# Altium footprint library Connectors THD.PcbLib: 631 footprints (part 22 of 46)
Each footprint in its own frame and in the unit in brackets; x right, y up, seen from the top. Pads: shape width x height; smd on the part's side, far side on the other; paste and mask are expansions set on the pad; w line width, h text height; cw(c..) or ccw(c..) is an arc to the next point about the centre after c.
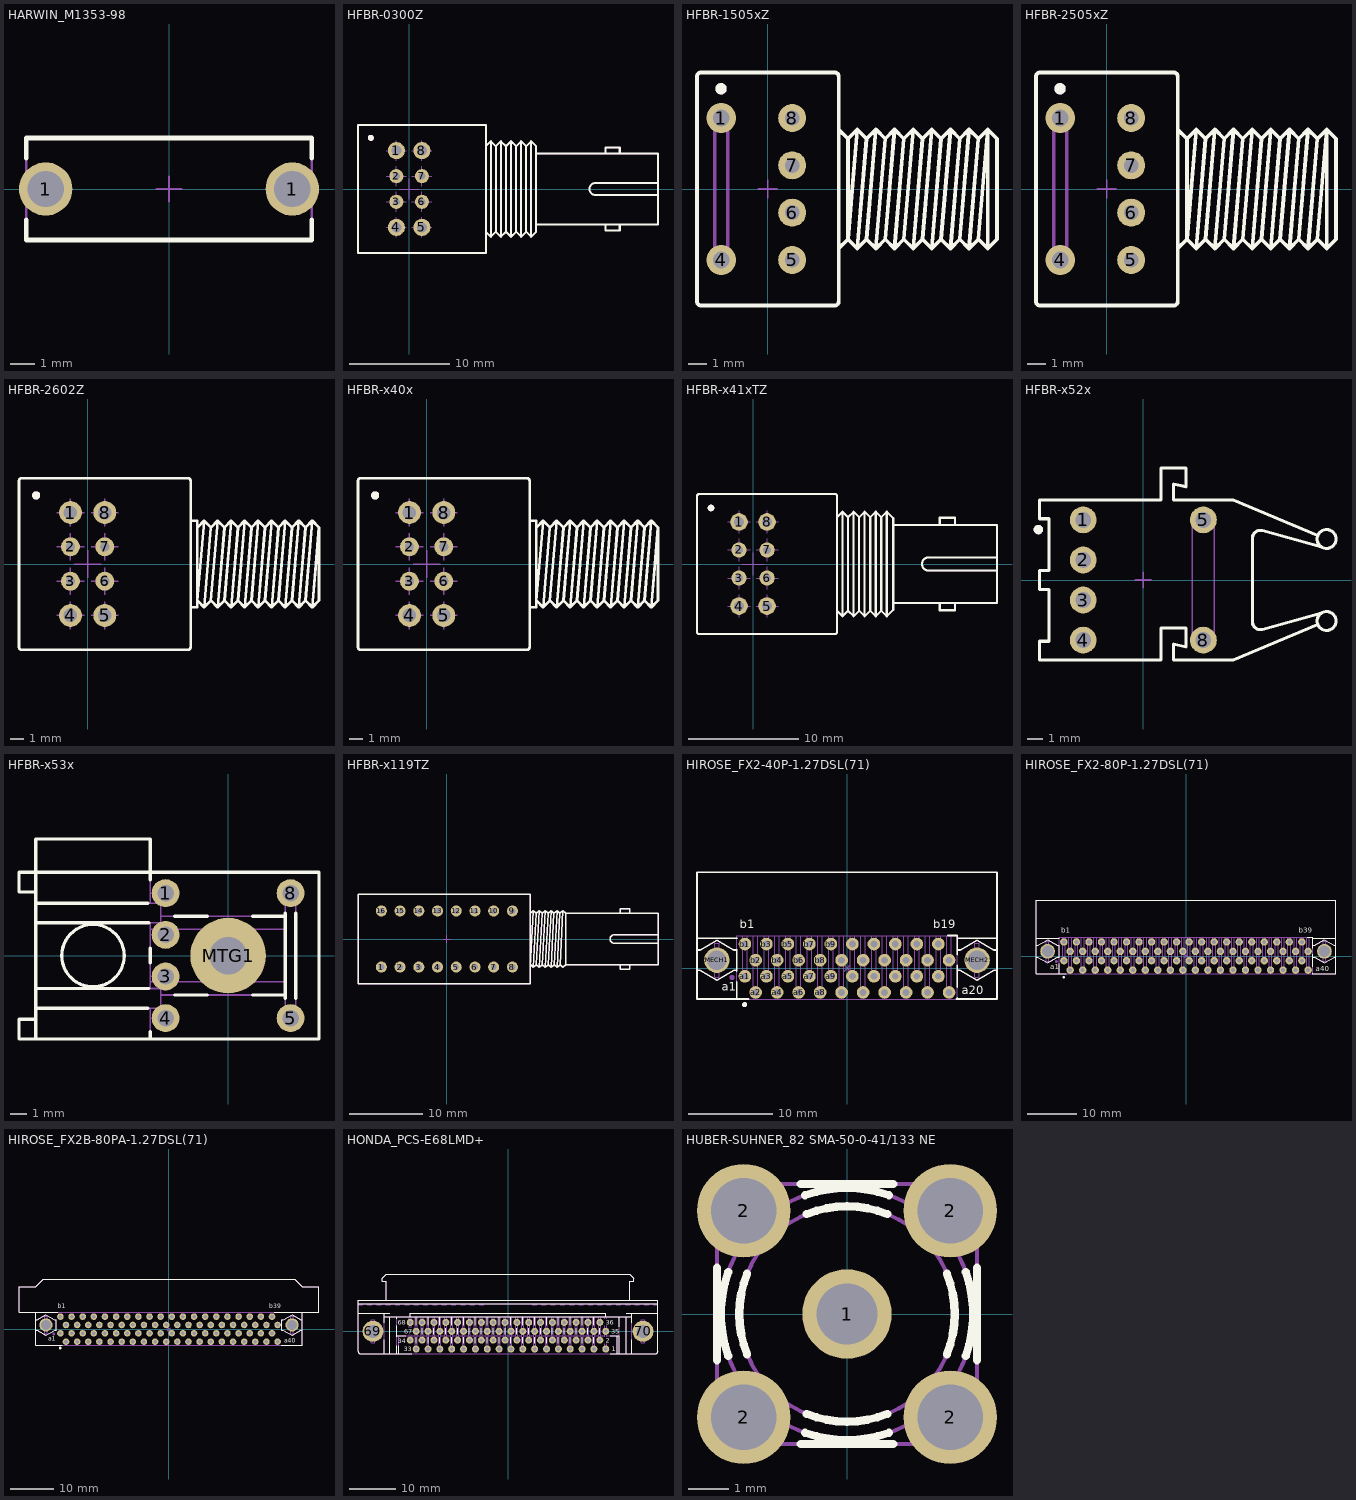
[diagram p21: the footprints below, top view; thin cyan lines are the x and y axes]

## HARWIN_M1353-98 [mm] "PC Board Test Jack for Ø2.03mm Probe"
height 5.16
pads (2):
  round 2.2 hole 1.5: 1(-5.08,0) 1(5.08,0)
Top Overlay:
  lines w0.2: -5.88,-1.269 -5.88,-2.105 5.88,-2.105 5.88,-1.269 ; -5.88,1.269 -5.88,2.105 5.88,2.105 5.88,1.269
Mechanical 8:
  lines w0.1: -5.58,0 -5.08,0 ; -5.08,-0.5 -5.08,0 ; -5.08,0.5 -5.08,0 ; -4.58,0 -5.08,0 ; -0.5,0 0,0 ; 0,-0.5 0,0 ; 0,0.5 0,0 ; 0.5,0 0,0 ; 4.58,0 5.08,0 ; 5.08,-0.5 5.08,0 ; 5.08,0.5 5.08,0 ; 5.58,0 5.08,0
Mechanical 14:
  lines w0.1: -5.88,-2.105 -5.88,2.105 5.88,2.105 5.88,-2.105 -5.88,-2.105
3D body: height 5.16, standoff -2.79, extent -5.88,-2.105 5.88,2.105

## HFBR-0300Z [mm] "HFBR-0300Z Series, Fiber Optic Transmitter or Receiver, Through Hole Mount"
height 10.2
pads (8):
  round 1.7 hole 1: 1(-1.27,3.81) 4(-1.27,-3.81) 5(1.27,-3.81) 8(1.27,3.81)
  round 1.4 hole 0.7: 2(-1.27,1.27) 3(-1.27,-1.27) 6(1.27,-1.27) 7(1.27,1.27)
Top Overlay:
  circle w0.3: c-3.81,5.08 r0.15
  lines w0.2: 7.62,-4.25 8.12,-4.75 ; 7.62,4.25 8.12,4.75 ; 12.62,-3.525 24.72,-3.525 ; 12.62,3.525 24.72,3.525 ; 19.52,-3.525 19.52,-4.1 20.92,-4.1 20.92,-3.525 ; 19.52,3.525 19.52,4.1 20.92,4.1 20.92,3.525 ; 24.72,-0.6 18.52,-0.6 cw(c18.52,0) 18.52,0.6 24.72,0.6 ; 8.12,-4.75 8.62,-4.25 ; 8.12,-4.75 8.12,4.75 ; 8.12,4.75 8.62,4.25 ; 8.62,-4.25 9.12,-4.75 ; 8.62,-4.25 8.62,4.25 ; 8.62,4.25 9.12,4.75 ; 9.12,-4.75 9.62,-4.25 ; 9.12,-4.75 9.12,4.75 ; 9.12,4.75 9.62,4.25 ; 9.62,-4.25 10.12,-4.75 ; 9.62,-4.25 9.62,4.25 ; 9.62,4.25 10.12,4.75 ; 10.12,-4.75 10.62,-4.25 ; 10.12,-4.75 10.12,4.75 ; 10.12,4.75 10.62,4.25 ; 10.62,-4.25 11.12,-4.75 ; 10.62,-4.25 10.62,4.25 ; 10.62,4.25 11.12,4.75 ; 11.12,-4.75 11.62,-4.25 ; 11.12,-4.75 11.12,4.75 ; 11.12,4.75 11.62,4.25 ; 11.62,-4.25 12.12,-4.75 ; 11.62,-4.25 11.62,4.25 ; 11.62,4.25 12.12,4.75 ; 12.12,-4.75 12.62,-4.25 12.62,4.25 12.12,4.75 ; 12.12,-4.75 12.12,4.75 ; 24.72,-3.525 24.72,3.525 ; 24.72,-3.525 24.72,3.525 ; -5.08,-6.35 -5.08,6.35 7.62,6.35 7.62,-6.35 -5.08,-6.35
Mechanical 8:
  lines w0.1: -2.27,-3.81 -1.27,-3.81 ; -2.27,-1.27 -1.27,-1.27 ; -2.27,1.27 -1.27,1.27 ; -2.27,3.81 -1.27,3.81 ; -1.27,-4.81 -1.27,-3.81 ; -1.27,-2.81 -1.27,-3.81 ; -1.27,-2.27 -1.27,-1.27 ; -1.27,-0.27 -1.27,-1.27 ; -1.27,0.27 -1.27,1.27 ; -1.27,2.27 -1.27,1.27 ; -1.27,2.81 -1.27,3.81 ; -1.27,4.81 -1.27,3.81 ; -1,0 0,0 ; -0.27,-3.81 -1.27,-3.81 ; -0.27,-1.27 -1.27,-1.27 ; -0.27,1.27 -1.27,1.27 ; -0.27,3.81 -1.27,3.81 ; 0,-1 0,0 ; 0,1 0,0 ; 0.27,-3.81 1.27,-3.81 ; 0.27,-1.27 1.27,-1.27 ; 0.27,1.27 1.27,1.27 ; 0.27,3.81 1.27,3.81 ; 1,0 0,0 ; 1.27,-4.81 1.27,-3.81 ; 1.27,-2.81 1.27,-3.81 ; 1.27,-2.27 1.27,-1.27 ; 1.27,-0.27 1.27,-1.27 ; 1.27,0.27 1.27,1.27 ; 1.27,2.27 1.27,1.27 ; 1.27,2.81 1.27,3.81 ; 1.27,4.81 1.27,3.81 ; 2.27,-3.81 1.27,-3.81 ; 2.27,-1.27 1.27,-1.27 ; 2.27,1.27 1.27,1.27 ; 2.27,3.81 1.27,3.81
Mechanical 14:
  circle w0.3: c-3.81,5.08 r0.15
  lines w0.1: 7.62,-4.25 8.12,-4.75 ; 7.62,4.25 8.12,4.75 ; 12.62,-3.525 24.72,-3.525 24.72,3.525 12.62,3.525 ; 19.52,-3.525 19.52,-4.1 20.92,-4.1 20.92,-3.525 ; 19.52,3.525 19.52,4.1 20.92,4.1 20.92,3.525 ; 24.72,-0.6 18.52,-0.6 cw(c18.52,0) 18.52,0.6 24.72,0.6 ; 8.12,-4.75 8.62,-4.25 ; 8.12,-4.75 8.12,4.75 ; 8.12,4.75 8.62,4.25 ; 8.62,-4.25 9.12,-4.75 ; 8.62,-4.25 8.62,4.25 ; 8.62,4.25 9.12,4.75 ; 9.12,-4.75 9.62,-4.25 ; 9.12,-4.75 9.12,4.75 ; 9.12,4.75 9.62,4.25 ; 9.62,-4.25 10.12,-4.75 ; 9.62,-4.25 9.62,4.25 ; 9.62,4.25 10.12,4.75 ; 10.12,-4.75 10.62,-4.25 ; 10.12,-4.75 10.12,4.75 ; 10.12,4.75 10.62,4.25 ; 10.62,-4.25 11.12,-4.75 ; 10.62,-4.25 10.62,4.25 ; 10.62,4.25 11.12,4.75 ; 11.12,-4.75 11.62,-4.25 ; 11.12,-4.75 11.12,4.75 ; 11.12,4.75 11.62,4.25 ; 11.62,-4.25 12.12,-4.75 ; 11.62,-4.25 11.62,4.25 ; 11.62,4.25 12.12,4.75 ; 12.12,-4.75 12.62,-4.25 12.62,4.25 12.12,4.75 ; 12.12,-4.75 12.12,4.75 ; -5.08,-6.15 ccw(c-4.88,-6.15) -4.88,-6.35 7.42,-6.35 ccw(c7.42,-6.15) 7.62,-6.15 7.62,6.15 ccw(c7.42,6.15) 7.42,6.35 -4.88,6.35 ccw(c-4.88,6.15) -5.08,6.15 -5.08,-6.15
3D body: height 10.2, standoff -3.6, extent -5.08,-6.35 24.72,6.35

## HFBR-1505xZ [mm] "HFBR-1505xZ Series, SMA Plastic Housed, Fiber Optic Transmitter"
height 10.2
pads (6):
  round 1.6 hole 0.9: 1(-2.5,3.81) 4(-2.5,-3.81)
  round 1.5 hole 0.8: 5(1.31,-3.81) 6(1.31,-1.27) 7(1.31,1.27) 8(1.31,3.81)
Top Overlay:
  circle w0.3: c-2.51,5.38 r0.15
  lines w0.2: 3.8,-3.2 4.3,-2.7 ; 3.8,3.2 4.3,2.7 ; 4.3,-2.7 4.3,2.7 ; 4.3,-2.7 4.8,-3.2 ; 4.3,-2.7 4.8,3.2 ; 4.3,2.7 4.8,3.2 ; 4.8,-3.2 5.3,-2.7 ; 4.8,-3.2 5.3,2.7 ; 4.8,3.2 5.3,2.7 ; 5.3,-2.7 5.8,-3.2 ; 5.3,-2.7 5.8,3.2 ; 5.3,2.7 5.8,3.2 ; 5.8,-3.2 6.3,-2.7 ; 5.8,-3.2 6.3,2.7 ; 5.8,3.2 6.3,2.7 ; 6.3,-2.7 6.8,-3.2 ; 6.3,-2.7 6.8,3.2 ; 6.3,2.7 6.8,3.2 ; 6.8,-3.2 7.3,-2.7 ; 6.8,-3.2 7.3,2.7 ; 6.8,3.2 7.3,2.7 ; 7.3,-2.7 7.8,-3.2 ; 7.3,-2.7 7.8,3.2 ; 7.3,2.7 7.8,3.2 ; 7.8,-3.2 8.3,-2.7 ; 7.8,-3.2 8.3,2.7 ; 7.8,3.2 8.3,2.7 ; 8.3,-2.7 8.8,-3.2 ; 8.3,-2.7 8.8,3.2 ; 8.3,2.7 8.8,3.2 ; 8.8,-3.2 9.3,-2.7 ; 8.8,-3.2 9.3,2.7 ; 8.8,3.2 9.3,2.7 ; 9.3,-2.7 9.8,-3.2 ; 9.3,-2.7 9.8,3.2 ; 9.3,2.7 9.8,3.2 ; 9.8,-3.2 10.3,-2.7 ; 9.8,-3.2 10.3,2.7 ; 9.8,3.2 10.3,2.7 ; 10.3,-2.7 10.8,-3.2 ; 10.3,-2.7 10.8,3.2 ; 10.3,2.7 10.8,3.2 ; 10.8,-3.2 11.3,-2.7 ; 10.8,-3.2 11.3,2.7 ; 10.8,3.2 11.3,2.7 ; 11.3,-2.7 11.8,-3.2 ; 11.3,-2.7 11.8,3.2 ; 11.3,2.7 11.8,3.2 ; 11.8,-3.2 12.3,-2.7 12.3,2.7 11.8,3.2 ; 11.8,-3.2 11.8,3.2 ; -3.8,-6.05 ccw(c-3.6,-6.05) -3.6,-6.25 3.6,-6.25 ccw(c3.6,-6.05) 3.8,-6.05 3.8,6.05 ccw(c3.6,6.05) 3.6,6.25 -3.6,6.25 ccw(c-3.6,6.05) -3.8,6.05 -3.8,-6.05
Mechanical 8:
  lines w0.1: -3,-3.81 -2.5,-3.81 ; -3,3.81 -2.5,3.81 ; -2.5,-4.31 -2.5,-3.81 ; -2.5,-3.31 -2.5,-3.81 ; -2.5,3.31 -2.5,3.81 ; -2.5,4.31 -2.5,3.81 ; -2,-3.81 -2.5,-3.81 ; -2,3.81 -2.5,3.81 ; -0.5,0 0,0 ; 0,-0.5 0,0 ; 0,0.5 0,0 ; 0.5,0 0,0 ; 0.81,-3.81 1.31,-3.81 ; 0.81,-1.27 1.31,-1.27 ; 0.81,1.27 1.31,1.27 ; 0.81,3.81 1.31,3.81 ; 1.31,-4.31 1.31,-3.81 ; 1.31,-3.31 1.31,-3.81 ; 1.31,-1.77 1.31,-1.27 ; 1.31,-0.77 1.31,-1.27 ; 1.31,0.77 1.31,1.27 ; 1.31,1.77 1.31,1.27 ; 1.31,3.31 1.31,3.81 ; 1.31,4.31 1.31,3.81 ; 1.81,-3.81 1.31,-3.81 ; 1.81,-1.27 1.31,-1.27 ; 1.81,1.27 1.31,1.27 ; 1.81,3.81 1.31,3.81
Mechanical 14:
  circle w0.3: c-2.51,5.38 r0.15
  lines w0.1: 3.8,-3.2 4.3,-2.7 ; 3.8,3.2 4.3,2.7 ; 4.3,-2.7 4.3,2.7 ; 4.3,-2.7 4.8,-3.2 ; 4.3,-2.7 4.8,3.2 ; 4.3,2.7 4.8,3.2 ; 4.8,-3.2 5.3,-2.7 ; 4.8,-3.2 5.3,2.7 ; 4.8,3.2 5.3,2.7 ; 5.3,-2.7 5.8,-3.2 ; 5.3,-2.7 5.8,3.2 ; 5.3,2.7 5.8,3.2 ; 5.8,-3.2 6.3,-2.7 ; 5.8,-3.2 6.3,2.7 ; 5.8,3.2 6.3,2.7 ; 6.3,-2.7 6.8,-3.2 ; 6.3,-2.7 6.8,3.2 ; 6.3,2.7 6.8,3.2 ; 6.8,-3.2 7.3,-2.7 ; 6.8,-3.2 7.3,2.7 ; 6.8,3.2 7.3,2.7 ; 7.3,-2.7 7.8,-3.2 ; 7.3,-2.7 7.8,3.2 ; 7.3,2.7 7.8,3.2 ; 7.8,-3.2 8.3,-2.7 ; 7.8,-3.2 8.3,2.7 ; 7.8,3.2 8.3,2.7 ; 8.3,-2.7 8.8,-3.2 ; 8.3,-2.7 8.8,3.2 ; 8.3,2.7 8.8,3.2 ; 8.8,-3.2 9.3,-2.7 ; 8.8,-3.2 9.3,2.7 ; 8.8,3.2 9.3,2.7 ; 9.3,-2.7 9.8,-3.2 ; 9.3,-2.7 9.8,3.2 ; 9.3,2.7 9.8,3.2 ; 9.8,-3.2 10.3,-2.7 ; 9.8,-3.2 10.3,2.7 ; 9.8,3.2 10.3,2.7 ; 10.3,-2.7 10.8,-3.2 ; 10.3,-2.7 10.8,3.2 ; 10.3,2.7 10.8,3.2 ; 10.8,-3.2 11.3,-2.7 ; 10.8,-3.2 11.3,2.7 ; 10.8,3.2 11.3,2.7 ; 11.3,-2.7 11.8,-3.2 ; 11.3,-2.7 11.8,3.2 ; 11.3,2.7 11.8,3.2 ; 11.8,-3.2 12.3,-2.7 12.3,2.7 11.8,3.2 ; 11.8,-3.2 11.8,3.2 ; -3.8,-6.05 ccw(c-3.6,-6.05) -3.6,-6.25 3.6,-6.25 ccw(c3.6,-6.05) 3.8,-6.05 3.8,6.05 ccw(c3.6,6.05) 3.6,6.25 -3.6,6.25 ccw(c-3.6,6.05) -3.8,6.05 -3.8,-6.05 ; -2.9,-4.25 -2.9,4.25 -2.1,4.25 -2.1,-4.25 -2.9,-4.25 ; -2.8,-3.81 ccw(c-2.5,-3.81) -2.2,-3.81 -2.2,3.81 ccw(c-2.5,3.81) -2.8,3.81 -2.8,-3.81
3D body: height 10.2, standoff -2.8, extent -3.8,-6.249 12.3,6.249

## HFBR-2505xZ [mm] "HFBR-2505xZ Series, SMA Plastic Housed, Fiber Optic Receiver"
height 10.2
pads (6):
  round 1.6 hole 0.9: 1(-2.5,3.81) 4(-2.5,-3.81)
  round 1.5 hole 0.8: 5(1.31,-3.81) 6(1.31,-1.27) 7(1.31,1.27) 8(1.31,3.81)
Top Overlay:
  circle w0.3: c-2.51,5.38 r0.15
  lines w0.2: 3.8,-3.2 4.3,-2.7 ; 3.8,3.2 4.3,2.7 ; 4.3,-2.7 4.8,3.2 ; 4.3,-2.7 4.8,-3.2 ; 4.3,-2.7 4.3,2.7 ; 4.3,2.7 4.8,3.2 ; 4.8,-3.2 5.3,2.7 ; 4.8,-3.2 5.3,-2.7 ; 4.8,3.2 5.3,2.7 ; 5.3,-2.7 5.8,3.2 ; 5.3,-2.7 5.8,-3.2 ; 5.3,2.7 5.8,3.2 ; 5.8,-3.2 6.3,2.7 ; 5.8,-3.2 6.3,-2.7 ; 5.8,3.2 6.3,2.7 ; 6.3,-2.7 6.8,3.2 ; 6.3,-2.7 6.8,-3.2 ; 6.3,2.7 6.8,3.2 ; 6.8,-3.2 7.3,2.7 ; 6.8,-3.2 7.3,-2.7 ; 6.8,3.2 7.3,2.7 ; 7.3,-2.7 7.8,3.2 ; 7.3,-2.7 7.8,-3.2 ; 7.3,2.7 7.8,3.2 ; 7.8,-3.2 8.3,2.7 ; 7.8,-3.2 8.3,-2.7 ; 7.8,3.2 8.3,2.7 ; 8.3,-2.7 8.8,3.2 ; 8.3,-2.7 8.8,-3.2 ; 8.3,2.7 8.8,3.2 ; 8.8,-3.2 9.3,2.7 ; 8.8,-3.2 9.3,-2.7 ; 8.8,3.2 9.3,2.7 ; 9.3,-2.7 9.8,3.2 ; 9.3,-2.7 9.8,-3.2 ; 9.3,2.7 9.8,3.2 ; 9.8,-3.2 10.3,2.7 ; 9.8,-3.2 10.3,-2.7 ; 9.8,3.2 10.3,2.7 ; 10.3,-2.7 10.8,3.2 ; 10.3,-2.7 10.8,-3.2 ; 10.3,2.7 10.8,3.2 ; 10.8,-3.2 11.3,2.7 ; 10.8,-3.2 11.3,-2.7 ; 10.8,3.2 11.3,2.7 ; 11.3,-2.7 11.8,3.2 ; 11.3,-2.7 11.8,-3.2 ; 11.3,2.7 11.8,3.2 ; 11.8,-3.2 11.8,3.2 ; 11.8,-3.2 12.3,-2.7 12.3,2.7 11.8,3.2 ; -3.8,-6.05 ccw(c-3.6,-6.05) -3.6,-6.25 3.6,-6.25 ccw(c3.6,-6.05) 3.8,-6.05 3.8,6.05 ccw(c3.6,6.05) 3.6,6.25 -3.6,6.25 ccw(c-3.6,6.05) -3.8,6.05 -3.8,-6.05
Mechanical 8:
  lines w0.1: -3,-3.81 -2.5,-3.81 ; -3,3.81 -2.5,3.81 ; -2.5,-4.31 -2.5,-3.81 ; -2.5,-3.31 -2.5,-3.81 ; -2.5,3.31 -2.5,3.81 ; -2.5,4.31 -2.5,3.81 ; -2,-3.81 -2.5,-3.81 ; -2,3.81 -2.5,3.81 ; -0.5,0 0,0 ; 0,-0.5 0,0 ; 0,0.5 0,0 ; 0.5,0 0,0 ; 0.81,-3.81 1.31,-3.81 ; 0.81,-1.27 1.31,-1.27 ; 0.81,1.27 1.31,1.27 ; 0.81,3.81 1.31,3.81 ; 1.31,-4.31 1.31,-3.81 ; 1.31,-3.31 1.31,-3.81 ; 1.31,-1.77 1.31,-1.27 ; 1.31,-0.77 1.31,-1.27 ; 1.31,0.77 1.31,1.27 ; 1.31,1.77 1.31,1.27 ; 1.31,3.31 1.31,3.81 ; 1.31,4.31 1.31,3.81 ; 1.81,-3.81 1.31,-3.81 ; 1.81,-1.27 1.31,-1.27 ; 1.81,1.27 1.31,1.27 ; 1.81,3.81 1.31,3.81
Mechanical 14:
  circle w0.3: c-2.51,5.38 r0.15
  lines w0.1: 3.8,-3.2 4.3,-2.7 ; 3.8,3.2 4.3,2.7 ; 4.3,-2.7 4.8,3.2 ; 4.3,-2.7 4.8,-3.2 ; 4.3,-2.7 4.3,2.7 ; 4.3,2.7 4.8,3.2 ; 4.8,-3.2 5.3,2.7 ; 4.8,-3.2 5.3,-2.7 ; 4.8,3.2 5.3,2.7 ; 5.3,-2.7 5.8,3.2 ; 5.3,-2.7 5.8,-3.2 ; 5.3,2.7 5.8,3.2 ; 5.8,-3.2 6.3,2.7 ; 5.8,-3.2 6.3,-2.7 ; 5.8,3.2 6.3,2.7 ; 6.3,-2.7 6.8,3.2 ; 6.3,-2.7 6.8,-3.2 ; 6.3,2.7 6.8,3.2 ; 6.8,-3.2 7.3,2.7 ; 6.8,-3.2 7.3,-2.7 ; 6.8,3.2 7.3,2.7 ; 7.3,-2.7 7.8,3.2 ; 7.3,-2.7 7.8,-3.2 ; 7.3,2.7 7.8,3.2 ; 7.8,-3.2 8.3,2.7 ; 7.8,-3.2 8.3,-2.7 ; 7.8,3.2 8.3,2.7 ; 8.3,-2.7 8.8,3.2 ; 8.3,-2.7 8.8,-3.2 ; 8.3,2.7 8.8,3.2 ; 8.8,-3.2 9.3,2.7 ; 8.8,-3.2 9.3,-2.7 ; 8.8,3.2 9.3,2.7 ; 9.3,-2.7 9.8,3.2 ; 9.3,-2.7 9.8,-3.2 ; 9.3,2.7 9.8,3.2 ; 9.8,-3.2 10.3,2.7 ; 9.8,-3.2 10.3,-2.7 ; 9.8,3.2 10.3,2.7 ; 10.3,-2.7 10.8,3.2 ; 10.3,-2.7 10.8,-3.2 ; 10.3,2.7 10.8,3.2 ; 10.8,-3.2 11.3,2.7 ; 10.8,-3.2 11.3,-2.7 ; 10.8,3.2 11.3,2.7 ; 11.3,-2.7 11.8,3.2 ; 11.3,-2.7 11.8,-3.2 ; 11.3,2.7 11.8,3.2 ; 11.8,-3.2 11.8,3.2 ; 11.8,-3.2 12.3,-2.7 12.3,2.7 11.8,3.2 ; -3.8,-6.05 ccw(c-3.6,-6.05) -3.6,-6.25 3.6,-6.25 ccw(c3.6,-6.05) 3.8,-6.05 3.8,6.05 ccw(c3.6,6.05) 3.6,6.25 -3.6,6.25 ccw(c-3.6,6.05) -3.8,6.05 -3.8,-6.05 ; -2.9,-4.25 -2.1,-4.25 -2.1,4.25 -2.9,4.25 -2.9,-4.25 ; -2.8,-3.81 ccw(c-2.5,-3.81) -2.2,-3.81 -2.2,3.81 ccw(c-2.5,3.81) -2.8,3.81 -2.8,-3.81
3D body: height 10.2, standoff -2.8, extent -3.8,-6.249 12.3,6.249

## HFBR-2602Z [mm] "HFBR-2602Z Series, Fiber Optic Receiver, Through Hole Mount"
height 10.2
pads (8):
  round 1.7 hole 1: 1(-1.27,3.81) 4(-1.27,-3.81) 5(1.27,-3.81) 8(1.27,3.81)
  round 1.4 hole 0.7: 2(-1.27,1.27) 3(-1.27,-1.27) 6(1.27,-1.27) 7(1.27,1.27)
Top Overlay:
  circle w0.3: c-3.81,5.08 r0.15
  lines w0.2: 7.62,-3.2 8.12,-3.2 8.12,3.2 7.62,3.2 ; 8.12,2.7 8.62,3.2 ; 8.62,-3.2 9.12,2.7 ; 8.62,-3.2 8.12,-2.7 8.62,3.2 ; 8.62,-3.2 9.12,-2.7 ; 8.62,3.2 9.12,2.7 ; 9.12,-2.7 9.62,3.2 ; 9.12,-2.7 9.62,-3.2 ; 9.12,2.7 9.62,3.2 ; 9.62,-3.2 10.12,2.7 ; 9.62,-3.2 10.12,-2.7 ; 9.62,3.2 10.12,2.7 ; 10.12,-2.7 10.62,3.2 ; 10.12,-2.7 10.62,-3.2 ; 10.12,2.7 10.62,3.2 ; 10.62,-3.2 11.12,2.7 ; 10.62,-3.2 11.12,-2.7 ; 10.62,3.2 11.12,2.7 ; 11.12,-2.7 11.62,3.2 ; 11.12,-2.7 11.62,-3.2 ; 11.12,2.7 11.62,3.2 ; 11.62,-3.2 12.12,2.7 ; 11.62,-3.2 12.12,-2.7 ; 11.62,3.2 12.12,2.7 ; 12.12,-2.7 12.62,3.2 ; 12.12,-2.7 12.62,-3.2 ; 12.12,2.7 12.62,3.2 ; 12.62,-3.2 13.12,2.7 ; 12.62,-3.2 13.12,-2.7 ; 12.62,3.2 13.12,2.7 ; 13.12,-2.7 13.62,3.2 ; 13.12,-2.7 13.62,-3.2 ; 13.12,2.7 13.62,3.2 ; 13.62,-3.2 14.12,2.7 ; 13.62,-3.2 14.12,-2.7 ; 13.62,3.2 14.12,2.7 ; 14.12,-2.7 14.62,3.2 ; 14.12,-2.7 14.62,-3.2 ; 14.12,2.7 14.62,3.2 ; 14.62,-3.2 15.12,2.7 ; 14.62,-3.2 15.12,-2.7 ; 14.62,3.2 15.12,2.7 ; 15.12,-2.7 15.62,3.2 ; 15.12,-2.7 15.62,-3.2 ; 15.12,2.7 15.62,3.2 ; 15.62,-3.2 16.12,2.7 ; 15.62,-3.2 16.12,-2.7 ; 15.62,3.2 16.12,2.7 ; 16.12,-2.7 16.62,3.2 ; 16.12,-2.7 16.62,-3.2 ; 16.12,2.7 16.62,3.2 ; 16.62,-3.2 17.12,2.7 ; 16.62,-3.2 17.12,-2.7 17.12,2.7 ; 16.62,3.2 17.12,2.7 ; -5.08,-6.15 ccw(c-4.88,-6.15) -4.88,-6.35 7.42,-6.35 ccw(c7.42,-6.15) 7.62,-6.15 7.62,6.15 ccw(c7.42,6.15) 7.42,6.35 -4.88,6.35 ccw(c-4.88,6.15) -5.08,6.15 -5.08,-6.15
Mechanical 8:
  lines w0.1: -2.27,-3.81 -1.27,-3.81 ; -2.27,-1.27 -1.27,-1.27 ; -2.27,1.27 -1.27,1.27 ; -2.27,3.81 -1.27,3.81 ; -1.27,-4.81 -1.27,-3.81 ; -1.27,-2.81 -1.27,-3.81 ; -1.27,-2.27 -1.27,-1.27 ; -1.27,-0.27 -1.27,-1.27 ; -1.27,0.27 -1.27,1.27 ; -1.27,2.27 -1.27,1.27 ; -1.27,2.81 -1.27,3.81 ; -1.27,4.81 -1.27,3.81 ; -1,0 0,0 ; -0.27,-3.81 -1.27,-3.81 ; -0.27,-1.27 -1.27,-1.27 ; -0.27,1.27 -1.27,1.27 ; -0.27,3.81 -1.27,3.81 ; 0,-1 0,0 ; 0,1 0,0 ; 0.27,-3.81 1.27,-3.81 ; 0.27,-1.27 1.27,-1.27 ; 0.27,1.27 1.27,1.27 ; 0.27,3.81 1.27,3.81 ; 1,0 0,0 ; 1.27,-4.81 1.27,-3.81 ; 1.27,-2.81 1.27,-3.81 ; 1.27,-2.27 1.27,-1.27 ; 1.27,-0.27 1.27,-1.27 ; 1.27,0.27 1.27,1.27 ; 1.27,2.27 1.27,1.27 ; 1.27,2.81 1.27,3.81 ; 1.27,4.81 1.27,3.81 ; 2.27,-3.81 1.27,-3.81 ; 2.27,-1.27 1.27,-1.27 ; 2.27,1.27 1.27,1.27 ; 2.27,3.81 1.27,3.81
Mechanical 14:
  circle w0.3: c-3.81,5.08 r0.15
  lines w0.1: 7.62,-3.2 8.12,-3.2 8.12,3.2 7.62,3.2 ; 8.12,2.7 8.62,3.2 ; 8.62,-3.2 9.12,2.7 ; 8.62,-3.2 8.12,-2.7 8.62,3.2 ; 8.62,-3.2 9.12,-2.7 ; 8.62,3.2 9.12,2.7 ; 9.12,-2.7 9.62,3.2 ; 9.12,-2.7 9.62,-3.2 ; 9.12,2.7 9.62,3.2 ; 9.62,-3.2 10.12,2.7 ; 9.62,-3.2 10.12,-2.7 ; 9.62,3.2 10.12,2.7 ; 10.12,-2.7 10.62,3.2 ; 10.12,-2.7 10.62,-3.2 ; 10.12,2.7 10.62,3.2 ; 10.62,-3.2 11.12,2.7 ; 10.62,-3.2 11.12,-2.7 ; 10.62,3.2 11.12,2.7 ; 11.12,-2.7 11.62,3.2 ; 11.12,-2.7 11.62,-3.2 ; 11.12,2.7 11.62,3.2 ; 11.62,-3.2 12.12,2.7 ; 11.62,-3.2 12.12,-2.7 ; 11.62,3.2 12.12,2.7 ; 12.12,-2.7 12.62,3.2 ; 12.12,-2.7 12.62,-3.2 ; 12.12,2.7 12.62,3.2 ; 12.62,-3.2 13.12,2.7 ; 12.62,-3.2 13.12,-2.7 ; 12.62,3.2 13.12,2.7 ; 13.12,-2.7 13.62,3.2 ; 13.12,-2.7 13.62,-3.2 ; 13.12,2.7 13.62,3.2 ; 13.62,-3.2 14.12,2.7 ; 13.62,-3.2 14.12,-2.7 ; 13.62,3.2 14.12,2.7 ; 14.12,-2.7 14.62,3.2 ; 14.12,-2.7 14.62,-3.2 ; 14.12,2.7 14.62,3.2 ; 14.62,-3.2 15.12,2.7 ; 14.62,-3.2 15.12,-2.7 ; 14.62,3.2 15.12,2.7 ; 15.12,-2.7 15.62,3.2 ; 15.12,-2.7 15.62,-3.2 ; 15.12,2.7 15.62,3.2 ; 15.62,-3.2 16.12,2.7 ; 15.62,-3.2 16.12,-2.7 ; 15.62,3.2 16.12,2.7 ; 16.12,-2.7 16.62,3.2 ; 16.12,-2.7 16.62,-3.2 ; 16.12,2.7 16.62,3.2 ; 16.62,-3.2 17.12,2.7 ; 16.62,-3.2 17.12,-2.7 17.12,2.7 ; 16.62,3.2 17.12,2.7 ; -5.08,-6.15 ccw(c-4.88,-6.15) -4.88,-6.35 7.42,-6.35 ccw(c7.42,-6.15) 7.62,-6.15 7.62,6.15 ccw(c7.42,6.15) 7.42,6.35 -4.88,6.35 ccw(c-4.88,6.15) -5.08,6.15 -5.08,-6.15
3D body: height 10.2, standoff -3.6, extent -5.08,-6.348 17.62,6.348

## HFBR-x40x [mm] "HFBR-0400Z Series, Fiber Optic Transmitter or Receiver, Through Hole Mount"
height 10.2
pads (8):
  round 1.7 hole 1: 1(-1.27,3.81) 4(-1.27,-3.81) 5(1.27,-3.81) 8(1.27,3.81)
  round 1.4 hole 0.7: 2(-1.27,1.27) 3(-1.27,-1.27) 6(1.27,-1.27) 7(1.27,1.27)
Top Overlay:
  circle w0.3: c-3.81,5.08 r0.15
  lines w0.2: 7.62,-3.2 8.12,-3.2 8.12,3.2 7.62,3.2 ; 8.12,2.7 8.62,3.2 ; 8.62,-3.2 9.12,2.7 ; 8.62,-3.2 8.12,-2.7 8.62,3.2 ; 8.62,-3.2 9.12,-2.7 ; 8.62,3.2 9.12,2.7 ; 9.12,-2.7 9.62,3.2 ; 9.12,-2.7 9.62,-3.2 ; 9.12,2.7 9.62,3.2 ; 9.62,-3.2 10.12,2.7 ; 9.62,-3.2 10.12,-2.7 ; 9.62,3.2 10.12,2.7 ; 10.12,-2.7 10.62,3.2 ; 10.12,-2.7 10.62,-3.2 ; 10.12,2.7 10.62,3.2 ; 10.62,-3.2 11.12,2.7 ; 10.62,-3.2 11.12,-2.7 ; 10.62,3.2 11.12,2.7 ; 11.12,-2.7 11.62,3.2 ; 11.12,-2.7 11.62,-3.2 ; 11.12,2.7 11.62,3.2 ; 11.62,-3.2 12.12,2.7 ; 11.62,-3.2 12.12,-2.7 ; 11.62,3.2 12.12,2.7 ; 12.12,-2.7 12.62,3.2 ; 12.12,-2.7 12.62,-3.2 ; 12.12,2.7 12.62,3.2 ; 12.62,-3.2 13.12,2.7 ; 12.62,-3.2 13.12,-2.7 ; 12.62,3.2 13.12,2.7 ; 13.12,-2.7 13.62,3.2 ; 13.12,-2.7 13.62,-3.2 ; 13.12,2.7 13.62,3.2 ; 13.62,-3.2 14.12,2.7 ; 13.62,-3.2 14.12,-2.7 ; 13.62,3.2 14.12,2.7 ; 14.12,-2.7 14.62,3.2 ; 14.12,-2.7 14.62,-3.2 ; 14.12,2.7 14.62,3.2 ; 14.62,-3.2 15.12,2.7 ; 14.62,-3.2 15.12,-2.7 ; 14.62,3.2 15.12,2.7 ; 15.12,-2.7 15.62,3.2 ; 15.12,-2.7 15.62,-3.2 ; 15.12,2.7 15.62,3.2 ; 15.62,-3.2 16.12,2.7 ; 15.62,-3.2 16.12,-2.7 ; 15.62,3.2 16.12,2.7 ; 16.12,-2.7 16.62,3.2 ; 16.12,-2.7 16.62,-3.2 ; 16.12,2.7 16.62,3.2 ; 16.62,-3.2 17.12,2.7 ; 16.62,-3.2 17.12,-2.7 17.12,2.7 ; 16.62,3.2 17.12,2.7 ; -5.08,-6.15 ccw(c-4.88,-6.15) -4.88,-6.35 7.42,-6.35 ccw(c7.42,-6.15) 7.62,-6.15 7.62,6.15 ccw(c7.42,6.15) 7.42,6.35 -4.88,6.35 ccw(c-4.88,6.15) -5.08,6.15 -5.08,-6.15
Mechanical 8:
  lines w0.1: -2.27,-3.81 -1.27,-3.81 ; -2.27,-1.27 -1.27,-1.27 ; -2.27,1.27 -1.27,1.27 ; -2.27,3.81 -1.27,3.81 ; -1.27,-4.81 -1.27,-3.81 ; -1.27,-2.81 -1.27,-3.81 ; -1.27,-2.27 -1.27,-1.27 ; -1.27,-0.27 -1.27,-1.27 ; -1.27,0.27 -1.27,1.27 ; -1.27,2.27 -1.27,1.27 ; -1.27,2.81 -1.27,3.81 ; -1.27,4.81 -1.27,3.81 ; -1,0 0,0 ; -0.27,-3.81 -1.27,-3.81 ; -0.27,-1.27 -1.27,-1.27 ; -0.27,1.27 -1.27,1.27 ; -0.27,3.81 -1.27,3.81 ; 0,-1 0,0 ; 0,1 0,0 ; 0.27,-3.81 1.27,-3.81 ; 0.27,-1.27 1.27,-1.27 ; 0.27,1.27 1.27,1.27 ; 0.27,3.81 1.27,3.81 ; 1,0 0,0 ; 1.27,-4.81 1.27,-3.81 ; 1.27,-2.81 1.27,-3.81 ; 1.27,-2.27 1.27,-1.27 ; 1.27,-0.27 1.27,-1.27 ; 1.27,0.27 1.27,1.27 ; 1.27,2.27 1.27,1.27 ; 1.27,2.81 1.27,3.81 ; 1.27,4.81 1.27,3.81 ; 2.27,-3.81 1.27,-3.81 ; 2.27,-1.27 1.27,-1.27 ; 2.27,1.27 1.27,1.27 ; 2.27,3.81 1.27,3.81
Mechanical 14:
  circle w0.3: c-3.81,5.08 r0.15
  lines w0.1: 7.62,-3.2 8.12,-3.2 8.12,3.2 7.62,3.2 ; 8.12,2.7 8.62,3.2 ; 8.62,-3.2 9.12,2.7 ; 8.62,-3.2 8.12,-2.7 8.62,3.2 ; 8.62,-3.2 9.12,-2.7 ; 8.62,3.2 9.12,2.7 ; 9.12,-2.7 9.62,3.2 ; 9.12,-2.7 9.62,-3.2 ; 9.12,2.7 9.62,3.2 ; 9.62,-3.2 10.12,2.7 ; 9.62,-3.2 10.12,-2.7 ; 9.62,3.2 10.12,2.7 ; 10.12,-2.7 10.62,3.2 ; 10.12,-2.7 10.62,-3.2 ; 10.12,2.7 10.62,3.2 ; 10.62,-3.2 11.12,2.7 ; 10.62,-3.2 11.12,-2.7 ; 10.62,3.2 11.12,2.7 ; 11.12,-2.7 11.62,3.2 ; 11.12,-2.7 11.62,-3.2 ; 11.12,2.7 11.62,3.2 ; 11.62,-3.2 12.12,2.7 ; 11.62,-3.2 12.12,-2.7 ; 11.62,3.2 12.12,2.7 ; 12.12,-2.7 12.62,3.2 ; 12.12,-2.7 12.62,-3.2 ; 12.12,2.7 12.62,3.2 ; 12.62,-3.2 13.12,2.7 ; 12.62,-3.2 13.12,-2.7 ; 12.62,3.2 13.12,2.7 ; 13.12,-2.7 13.62,3.2 ; 13.12,-2.7 13.62,-3.2 ; 13.12,2.7 13.62,3.2 ; 13.62,-3.2 14.12,2.7 ; 13.62,-3.2 14.12,-2.7 ; 13.62,3.2 14.12,2.7 ; 14.12,-2.7 14.62,3.2 ; 14.12,-2.7 14.62,-3.2 ; 14.12,2.7 14.62,3.2 ; 14.62,-3.2 15.12,2.7 ; 14.62,-3.2 15.12,-2.7 ; 14.62,3.2 15.12,2.7 ; 15.12,-2.7 15.62,3.2 ; 15.12,-2.7 15.62,-3.2 ; 15.12,2.7 15.62,3.2 ; 15.62,-3.2 16.12,2.7 ; 15.62,-3.2 16.12,-2.7 ; 15.62,3.2 16.12,2.7 ; 16.12,-2.7 16.62,3.2 ; 16.12,-2.7 16.62,-3.2 ; 16.12,2.7 16.62,3.2 ; 16.62,-3.2 17.12,2.7 ; 16.62,-3.2 17.12,-2.7 17.12,2.7 ; 16.62,3.2 17.12,2.7 ; -5.08,-6.15 ccw(c-4.88,-6.15) -4.88,-6.35 7.42,-6.35 ccw(c7.42,-6.15) 7.62,-6.15 7.62,6.15 ccw(c7.42,6.15) 7.42,6.35 -4.88,6.35 ccw(c-4.88,6.15) -5.08,6.15 -5.08,-6.15
3D body: height 10.2, standoff -3.6, extent -5.08,-6.35 17.62,6.35

## HFBR-x41xTZ [mm] "HFBR-14xxZ, HFBR-14xxZ Series With Threaded ST Port, Fiber Optic Transmitter or Receiver, Through Hole Mount"
height 10.2
pads (8):
  round 1.6 hole 0.9: 1(-1.27,3.81) 4(-1.27,-3.81) 5(1.27,-3.81) 8(1.27,3.81)
  round 1.4 hole 0.7: 2(-1.27,1.27) 3(-1.27,-1.27) 6(1.27,-1.27) 7(1.27,1.27)
Top Overlay:
  circle w0.3: c-3.81,5.08 r0.15
  lines w0.2: 7.62,-4.25 8.12,-4.75 ; 7.62,4.25 8.12,4.75 ; 12.72,-3.525 22.12,-3.525 22.12,3.525 12.72,3.525 ; 16.92,-3.525 16.92,-4.2 18.32,-4.2 18.32,-3.525 ; 16.92,3.525 16.92,4.2 18.32,4.2 18.32,3.525 ; 22.12,-0.6 15.92,-0.6 cw(c15.92,0) 15.92,0.6 22.12,0.6 ; 8.12,-4.75 8.12,4.75 ; 8.12,-4.75 8.62,-4.25 ; 8.12,4.75 8.62,4.25 ; 8.62,-4.25 8.62,4.25 ; 8.62,-4.25 9.12,-4.75 ; 8.62,4.25 9.12,4.75 ; 9.12,-4.75 9.12,4.75 ; 9.12,-4.75 9.62,-4.25 ; 9.12,4.75 9.62,4.25 ; 9.62,-4.25 9.62,4.25 ; 9.62,-4.25 10.12,-4.75 ; 9.62,4.25 10.12,4.75 ; 10.12,-4.75 10.12,4.75 ; 10.12,-4.75 10.62,-4.25 ; 10.12,4.75 10.62,4.25 ; 10.62,-4.25 10.62,4.25 ; 10.62,-4.25 11.12,-4.75 ; 10.62,4.25 11.12,4.75 ; 11.12,-4.75 11.12,4.75 ; 11.12,-4.75 11.62,-4.25 ; 11.12,4.75 11.62,4.25 ; 11.62,-4.25 11.62,4.25 ; 11.62,-4.25 12.12,-4.75 ; 11.62,4.25 12.12,4.75 ; 12.12,-4.75 12.12,4.75 ; 12.12,-4.75 12.72,-4.15 12.72,4.15 12.12,4.75 ; -5.08,-6.15 ccw(c-4.88,-6.15) -4.88,-6.35 7.42,-6.35 ccw(c7.42,-6.15) 7.62,-6.15 7.62,6.15 ccw(c7.42,6.15) 7.42,6.35 -4.88,6.35 ccw(c-4.88,6.15) -5.08,6.15 -5.08,-6.15
Mechanical 8:
  lines w0.1: -2.27,-3.81 -1.27,-3.81 ; -2.27,-1.27 -1.27,-1.27 ; -2.27,1.27 -1.27,1.27 ; -2.27,3.81 -1.27,3.81 ; -1.27,-4.81 -1.27,-3.81 ; -1.27,-2.81 -1.27,-3.81 ; -1.27,-2.27 -1.27,-1.27 ; -1.27,-0.27 -1.27,-1.27 ; -1.27,0.27 -1.27,1.27 ; -1.27,2.27 -1.27,1.27 ; -1.27,2.81 -1.27,3.81 ; -1.27,4.81 -1.27,3.81 ; -1,0 0,0 ; -0.27,-3.81 -1.27,-3.81 ; -0.27,-1.27 -1.27,-1.27 ; -0.27,1.27 -1.27,1.27 ; -0.27,3.81 -1.27,3.81 ; 0,-1 0,0 ; 0,1 0,0 ; 0.27,-3.81 1.27,-3.81 ; 0.27,-1.27 1.27,-1.27 ; 0.27,1.27 1.27,1.27 ; 0.27,3.81 1.27,3.81 ; 1,0 0,0 ; 1.27,-4.81 1.27,-3.81 ; 1.27,-2.81 1.27,-3.81 ; 1.27,-2.27 1.27,-1.27 ; 1.27,-0.27 1.27,-1.27 ; 1.27,0.27 1.27,1.27 ; 1.27,2.27 1.27,1.27 ; 1.27,2.81 1.27,3.81 ; 1.27,4.81 1.27,3.81 ; 2.27,-3.81 1.27,-3.81 ; 2.27,-1.27 1.27,-1.27 ; 2.27,1.27 1.27,1.27 ; 2.27,3.81 1.27,3.81
Mechanical 14:
  circle w0.3: c-3.81,5.08 r0.15
  lines w0.1: 7.62,-4.25 8.12,-4.75 ; 7.62,4.25 8.12,4.75 ; 12.72,-3.525 22.12,-3.525 22.12,3.525 12.72,3.525 ; 16.92,-3.525 16.92,-4.2 18.32,-4.2 18.32,-3.525 ; 16.92,3.525 16.92,4.2 18.32,4.2 18.32,3.525 ; 22.12,-0.6 15.92,-0.6 cw(c15.92,0) 15.92,0.6 22.12,0.6 ; 8.12,-4.75 8.12,4.75 ; 8.12,-4.75 8.62,-4.25 ; 8.12,4.75 8.62,4.25 ; 8.62,-4.25 8.62,4.25 ; 8.62,-4.25 9.12,-4.75 ; 8.62,4.25 9.12,4.75 ; 9.12,-4.75 9.12,4.75 ; 9.12,-4.75 9.62,-4.25 ; 9.12,4.75 9.62,4.25 ; 9.62,-4.25 9.62,4.25 ; 9.62,-4.25 10.12,-4.75 ; 9.62,4.25 10.12,4.75 ; 10.12,-4.75 10.12,4.75 ; 10.12,-4.75 10.62,-4.25 ; 10.12,4.75 10.62,4.25 ; 10.62,-4.25 10.62,4.25 ; 10.62,-4.25 11.12,-4.75 ; 10.62,4.25 11.12,4.75 ; 11.12,-4.75 11.12,4.75 ; 11.12,-4.75 11.62,-4.25 ; 11.12,4.75 11.62,4.25 ; 11.62,-4.25 11.62,4.25 ; 11.62,-4.25 12.12,-4.75 ; 11.62,4.25 12.12,4.75 ; 12.12,-4.75 12.12,4.75 ; 12.12,-4.75 12.72,-4.15 12.72,4.15 12.12,4.75 ; -5.08,-6.15 ccw(c-4.88,-6.15) -4.88,-6.35 7.42,-6.35 ccw(c7.42,-6.15) 7.62,-6.15 7.62,6.15 ccw(c7.42,6.15) 7.42,6.35 -4.88,6.35 ccw(c-4.88,6.15) -5.08,6.15 -5.08,-6.15